# Altium footprint library Module.PcbLib: 36 footprints (part 3 of 3)
Each footprint in its own frame and in the unit in brackets; x right, y up, seen from the top. Pads: shape width x height; smd on the part's side, far side on the other; paste and mask are expansions set on the pad; w line width, h text height; cw(c..) or ccw(c..) is an arc to the next point about the centre after c.
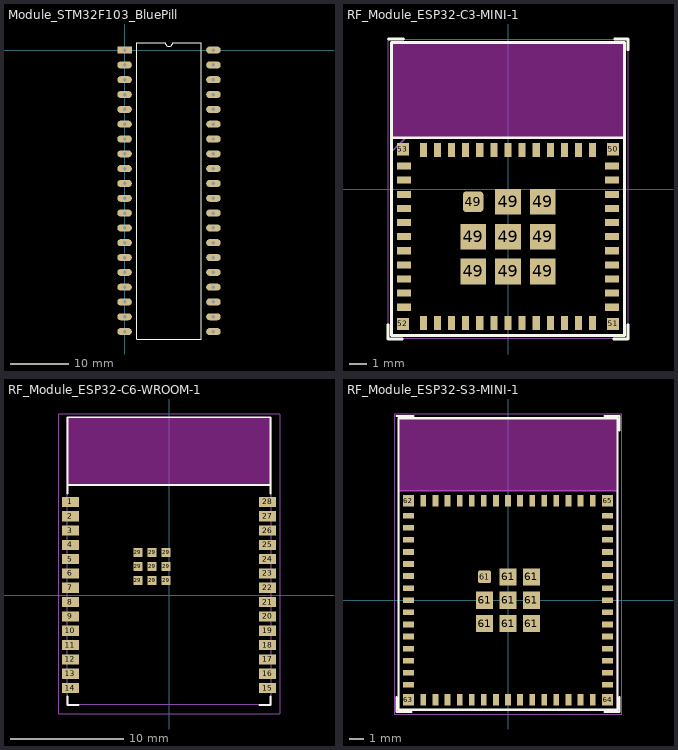
[diagram p2: the footprints below, top view; thin cyan lines are the x and y axes]

## Module_STM32F103_BluePill [mm] "STM32F103 Blue Pill development board, 40 pins, pitch 2.54mm"
pads (40):
  rect 2.5x1.2 hole 0.6: 1(0,0)
  oval 2.5x1.2 hole 0.6: 2(0,-2.54) 3(0,-5.08) 4(0,-7.62) 5(0,-10.16) 6(0,-12.7) 7(0,-15.24) 8(0,-17.78) 9(0,-20.32) 10(0,-22.86) 11(0,-25.4) 12(0,-27.94) 13(0,-30.48) 14(0,-33.02) 15(0,-35.56) 16(0,-38.1) 17(0,-40.64) 18(0,-43.18) 19(0,-45.72) 20(0,-48.26) 21(15.24,-48.26) 22(15.24,-45.72) 23(15.24,-43.18) 24(15.24,-40.64) 25(15.24,-38.1) 26(15.24,-35.56) 27(15.24,-33.02) 28(15.24,-30.48) 29(15.24,-27.94) 30(15.24,-25.4) 31(15.24,-22.86) 32(15.24,-20.32) 33(15.24,-17.78) 34(15.24,-15.24) 35(15.24,-12.7) 36(15.24,-10.16) 37(15.24,-7.62) 38(15.24,-5.08) 39(15.24,-2.54) 40(15.24,0)
Top Overlay:
  lines w0.2: 2.085,-49.53 2.085,1.27 6.985,1.27 ccw(c7.62,1.27) 8.255,1.27 13.155,1.27 13.155,-49.53 2.085,-49.53
3D body "STM32F103C8T6_Blue_Pill v6.step": height 16.12, standoff -2.15, extent -3.81,-53.966 19.05,3.594

## RF_Module_ESP32-C3-MINI-1 [mm] "ESP32-C3-MINI-1, RISC-V, Wi-Fi and BLE module — Mô-đun RISC-V, Wi-Fi và Bluetooth LE [Mo-dun RISC-V, Wi-Fi va Bluetooth LE]"
height 2.4
pads (61):
  rect 0.8x0.4 smd: 1(-5.9,1.3) 2(-5.9,0.5) 3(-5.9,-0.3) 4(-5.9,-1.1) 5(-5.9,-1.9) 6(-5.9,-2.7) 7(-5.9,-3.5) 8(-5.9,-4.3) 9(-5.9,-5.1) 10(-5.9,-5.9) 11(-5.9,-6.7) 25(5.9,-6.7) 26(5.9,-5.9) 27(5.9,-5.1) 28(5.9,-4.3) 29(5.9,-3.5) 30(5.9,-2.7) 31(5.9,-1.9) 32(5.9,-1.1) 33(5.9,-0.3) 34(5.9,0.5) 35(5.9,1.3)
  rect 0.4x0.8 smd: 12(-4.8,-7.6) 13(-4,-7.6) 14(-3.2,-7.6) 15(-2.4,-7.6) 16(-1.6,-7.6) 17(-0.8,-7.6) 18(0,-7.6) 19(0.8,-7.6) 20(1.6,-7.6) 21(2.4,-7.6) 22(3.2,-7.6) 23(4,-7.6) 24(4.8,-7.6) 36(4.8,2.2) 37(4,2.2) 38(3.2,2.2) 39(2.4,2.2) 40(1.6,2.2) 41(0.8,2.2) 42(0,2.2) 43(-0.8,2.2) 44(-1.6,2.2) 45(-2.4,2.2) 46(-3.2,2.2) 47(-4,2.2) 48(-4.8,2.2)
  rect 1.45x1.45 smd: 49(-1.975,-4.675) 49(-1.975,-2.7) 49(0,-4.675) 49(0,-2.7) 49(0,-0.725) 49(1.975,-4.675) 49(1.975,-2.7) 49(1.975,-0.725)
  rrect28% 1.15x1.15 smd: 49(-1.975,-0.725)
  rect 0.7x0.7 smd: 50(5.95,2.25) 51(5.95,-7.65) 52(-5.95,-7.65) 53(-5.95,2.25)
Top Overlay:
  lines w0.15: -6.8,-7.7 -6.8,-8.5 -6,-8.5 ; -6.775,8.5 -5.925,8.5 ; -6.6,2.9 6.6,2.9 ; 6,-8.5 6.8,-8.5 6.8,-7.7 ; 6.05,8.5 6.8,8.5 6.8,7.9 ; -6.6,-8.3 -6.6,8.3 6.6,8.3 6.6,-8.3 -6.6,-8.3
Keep-Out Layer:
  rectangle: -6.6,2.9 6.6,8.3
Mechanical 2:
  lines w0.1: -6.6,2.1 -5.8,2.9 ; -6.6,2.9 6.6,2.9 ; -6.6,-8.3 -6.6,8.3 6.6,8.3 6.6,-8.3 -6.6,-8.3
Mechanical 4:
  lines w0.05: -6.8,-8.5 -6.8,8.5 6.8,8.5 6.8,-8.5 -6.8,-8.5
3D body "ESP32-C3-MINI-1.step": height 0, standoff 0, extent -6.3,-8 6.3,2.6

## RF_Module_ESP32-C6-WROOM-1 [mm] "ESP32-C6-WROOM-1-N8, Wi-Fi 6, BLE and 802.15.4 module, 8 MB flash — Mô-đun Wi-Fi 6, BLE, Zigbee và Thread, flash 8 MB [Mo-dun Wi-Fi 6, BLE, Zigbee va Thread, flash 8 MB]"
height 3.2
pads (37):
  rect 1.5x0.9 smd: 1(-8.75,8.26) 2(-8.75,6.99) 3(-8.75,5.72) 4(-8.75,4.45) 5(-8.75,3.18) 6(-8.75,1.91) 7(-8.75,0.64) 8(-8.75,-0.63) 9(-8.75,-1.9) 10(-8.75,-3.17) 11(-8.75,-4.44) 12(-8.75,-5.71) 13(-8.75,-6.98) 14(-8.75,-8.25) 15(8.75,-8.25) 16(8.75,-6.98) 17(8.75,-5.71) 18(8.75,-4.44) 19(8.75,-3.17) 20(8.75,-1.9) 21(8.75,-0.63) 22(8.75,0.64) 23(8.75,1.91) 24(8.75,3.18) 25(8.75,4.45) 26(8.75,5.72) 27(8.75,6.99) 28(8.75,8.26)
  rect 0.8x0.8 smd: 29(-2.755,1.29) 29(-2.755,2.54) 29(-2.755,3.79) 29(-1.505,1.29) 29(-1.505,2.54) 29(-1.505,3.79) 29(-0.255,1.29) 29(-0.255,2.54) 29(-0.255,3.79)
Top Overlay:
  lines w0.15: -9,-9 -9,-9.75 -8,-9.75 ; -9,9 -9,15.75 9,15.75 9,9 ; -9,9.75 9,9.75 ; 8,-9.75 9,-9.75 9,-9
Keep-Out Layer:
  rectangle: -9,9.75 9,15.75
Mechanical 2:
  lines w0.1: -9,9.75 9,9.75 ; -9,-9.75 -9,15.75 9,15.75 9,-9.75 -9,-9.75
Mechanical 4:
  lines w0.05: -9.8,-10.55 -9.8,16.05 9.8,16.05 9.8,-10.55 -9.8,-10.55
3D body "ESP32-C6-WROOM-1.step": height 0, standoff 0, extent -9.5,-8.7 9.5,8.71

## RF_Module_ESP32-S3-MINI-1 [mm] "ESP32-S3-MINI-1, Wi-Fi and BLE module with Xtensa LX7 MCU — Mô-đun Wi-Fi và Bluetooth LE, vi điều khiển Xtensa LX7 [Mo-dun Wi-Fi va Bluetooth LE, vi dieu khien Xtensa LX7]"
height 2.4
pads (73):
  rect 0.8x0.4 smd: 1(-7,5.95) 2(-7,5.1) 3(-7,4.25) 4(-7,3.4) 5(-7,2.55) 6(-7,1.7) 7(-7,0.85) 8(-7,0) 9(-7,-0.85) 10(-7,-1.7) 11(-7,-2.55) 12(-7,-3.4) 13(-7,-4.25) 14(-7,-5.1) 15(-7,-5.95) 31(7,-5.95) 32(7,-5.1) 33(7,-4.25) 34(7,-3.4) 35(7,-2.55) 36(7,-1.7) 37(7,-0.85) 38(7,0) 39(7,0.85) 40(7,1.7) 41(7,2.55) 42(7,3.4) 43(7,4.25) 44(7,5.1) 45(7,5.95)
  rect 0.4x0.8 smd: 16(-5.95,-7) 17(-5.1,-7) 18(-4.25,-7) 19(-3.4,-7) 20(-2.55,-7) 21(-1.7,-7) 22(-0.85,-7) 23(0,-7) 24(0.85,-7) 25(1.7,-7) 26(2.55,-7) 27(3.4,-7) 28(4.25,-7) 29(5.1,-7) 30(5.95,-7) 46(5.95,7) 47(5.1,7) 48(4.25,7) 49(3.4,7) 50(2.55,7) 51(1.7,7) 52(0.85,7) 53(0,7) 54(-0.85,7) 55(-1.7,7) 56(-2.55,7) 57(-3.4,7) 58(-4.25,7) 59(-5.1,7) 60(-5.95,7)
  rect 1.2x1.2 smd: 61(-1.65,-1.65) 61(-1.65,0) 61(0,-1.65) 61(0,0) 61(0,1.65) 61(1.65,-1.65) 61(1.65,0) 61(1.65,1.65)
  rrect28% 0.9x0.9 smd: 61(-1.65,1.65)
  rect 0.8x0.8 smd: 62(-7,7) 63(-7,-7) 64(7,-7) 65(7,7)
Top Overlay:
  lines w0.15: -7.85,-6.8 -7.85,-7.85 -6.8,-7.85 ; -7.85,12.95 -6.65,12.95 ; 6.8,-7.85 7.85,-7.85 7.85,-6.8 ; 6.8,12.95 7.85,12.95 7.85,11.95 ; -7.7,-7.7 -7.7,7.7 -7.7,12.8 7.7,12.8 7.7,7.7 7.7,-7.7 -7.7,-7.7
Keep-Out Layer:
  rectangle: -7.7,7.7 7.7,12.8
Mechanical 2:
  lines w0.1: -7.7,-7.7 -7.7,7.7 7.7,7.7 7.7,-7.7 -7.7,-7.7
Mechanical 4:
  lines w0.05: -8,-8 -8,13.1 8,13.1 8,-8 -8,-8
3D body "ESP32-S3-MINI-1.step": height 0, standoff 0, extent -7.4,-7.4 7.4,7.4